# Altium footprint library 1.20-电感.PcbLib: 72 footprints (part 5 of 5)
Each footprint in its own frame and in the unit in brackets; x right, y up, seen from the top. Pads: shape width x height; smd on the part's side, far side on the other; paste and mask are expansions set on the pad; w line width, h text height; cw(c..) or ccw(c..) is an arc to the next point about the centre after c.
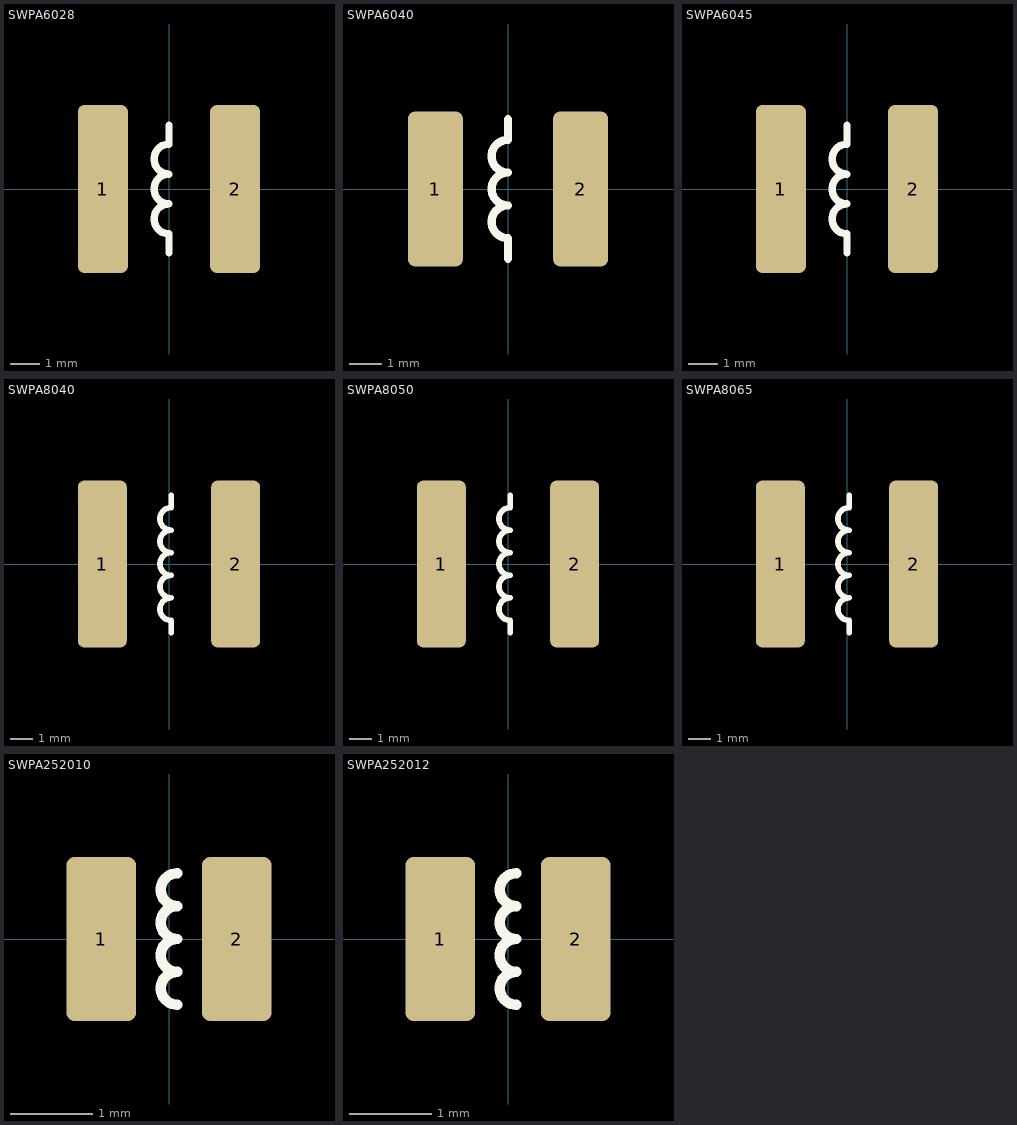
[diagram p4: the footprints below, top view; thin cyan lines are the x and y axes]

## SWPA6028 [mm] "轮廓6mm*6mm ，焊盘间距2.8mm       淘宝ID:黄晶宝石"
height 2.8
pads (2):
  rrect25% 1.7x5.7 smd: 1(-2.25,0) 2(2.25,0)
Top Overlay:
  lines w0.254: 0,-2.16 0,-1.6 ; 0,-1.524 cw(c0,-1.016) 0,-0.508 cw(c0,0) 0,0.508 cw(c0,1.016) 0,1.524 ; 0,1.6 0,2.16
3D body "6028S.STEP": height 2.5, standoff -0.02, extent -3,-3 3,3

## SWPA6040 [mm] "轮廓6mm*6mm ，焊盘间距2.8mm"
height 4
pads (2):
  rrect25% 1.7x4.8 smd: 1(-2.25,0) 2(2.25,0)
Top Overlay:
  lines w0.254: 0,-2.16 0,-1.6 ; 0,-1.524 cw(c0,-1.016) 0,-0.508 cw(c0,0) 0,0.508 cw(c0,1.016) 0,1.524 ; 0,1.6 0,2.16
3D body "5040S.STEP": height 4, standoff -0.02, extent -2.5,-2.5 2.5,2.5

## SWPA6045 [mm] "轮廓6mm*6mm ，焊盘间距2.8mm          淘宝ID:黄晶宝石"
height 4.5
pads (2):
  rrect25% 1.7x5.7 smd: 1(-2.25,0) 2(2.25,0)
Top Overlay:
  lines w0.254: 0,-2.16 0,-1.6 ; 0,-1.524 cw(c0,-1.016) 0,-0.508 cw(c0,0) 0,0.508 cw(c0,1.016) 0,1.524 ; 0,1.6 0,2.16
3D body "6045S.STEP": height 4.5, standoff -0.02, extent -3,-3 3,3

## SWPA8040 [mm] "轮廓8mm*8mm ，焊盘间距3.8mm          淘宝ID:黄晶宝石"
height 4
pads (2):
  rrect25% 2.2x7.5 smd: 1(-3,0) 2(3,0)
Top Overlay:
  lines w0.254: 0.1,-3.1 0.1,-2.54 cw(c0.1,-2.032) 0.1,-1.524 cw(c0.1,-1.016) 0.1,-0.508 cw(c0.1,0) 0.1,0.508 cw(c0.1,1.016) 0.1,1.524 cw(c0.1,2.032) 0.1,2.54 0.1,3.1
3D body "8040.STEP": height 4, standoff -0.02, extent -4,-4 4,4

## SWPA8050 [mm] "轮廓8mm*8mm ，焊盘间距3.8mm"
height 5
pads (2):
  rrect25% 2.2x7.5 smd: 1(-3,0) 2(3,0)
Top Overlay:
  lines w0.254: 0.1,-3.1 0.1,-2.54 cw(c0.1,-2.032) 0.1,-1.524 cw(c0.1,-1.016) 0.1,-0.508 cw(c0.1,0) 0.1,0.508 cw(c0.1,1.016) 0.1,1.524 cw(c0.1,2.032) 0.1,2.54 0.1,3.1
3D body "8050.STEP": height 5, standoff -0.02, extent -4,-4 4,4

## SWPA8065 [mm] "轮廓8mm*8mm ，焊盘间距3.8mm"
height 6.5
pads (2):
  rrect25% 2.2x7.5 smd: 1(-3,0) 2(3,0)
Top Overlay:
  lines w0.254: 0.1,-3.1 0.1,-2.54 cw(c0.1,-2.032) 0.1,-1.524 cw(c0.1,-1.016) 0.1,-0.508 cw(c0.1,0) 0.1,0.508 cw(c0.1,1.016) 0.1,1.524 cw(c0.1,2.032) 0.1,2.54 0.1,3.1
3D body "8065.STEP": height 6.5, standoff -0.02, extent -4,-4 4,4

## SWPA252010 [mm] "轮廓2.5mm*2mm ，焊盘间距0.8mm         淘宝ID:黄晶宝石"
height 1
pads (2):
  rrect25% 0.85x2 smd: 1(-0.825,0) 2(0.825,0)
Top Overlay:
  lines w0.127: 0.1,-0.8 cw(c0.1,-0.6) 0.1,-0.4 cw(c0.1,-0.2) 0.1,0 cw(c0.1,0.2) 0.1,0.4 cw(c0.1,0.6) 0.1,0.8
3D body "252010.STEP": height 1.03, standoff 0.01, extent -1.25,-1.25 1.25,1.25

## SWPA252012 [mm] "轮廓2.5mm*2mm ，焊盘间距0.8mm"
height 1.2
pads (2):
  rrect25% 0.85x2 smd: 1(-0.825,0) 2(0.825,0)
Top Overlay:
  lines w0.127: 0.1,-0.8 cw(c0.1,-0.6) 0.1,-0.4 cw(c0.1,-0.2) 0.1,0 cw(c0.1,0.2) 0.1,0.4 cw(c0.1,0.6) 0.1,0.8
3D body "252012.stp": height 1.2, standoff -0.07, extent -1.25,-1.25 1.25,1.25